# Altium footprint library 15EDGVC_VH.PcbLib: 46 footprints (part 3 of 3)
Each footprint in its own frame and in the unit in brackets; x right, y up, seen from the top. Pads: shape width x height; smd on the part's side, far side on the other; paste and mask are expansions set on the pad; w line width, h text height; cw(c..) or ccw(c..) is an arc to the next point about the centre after c.
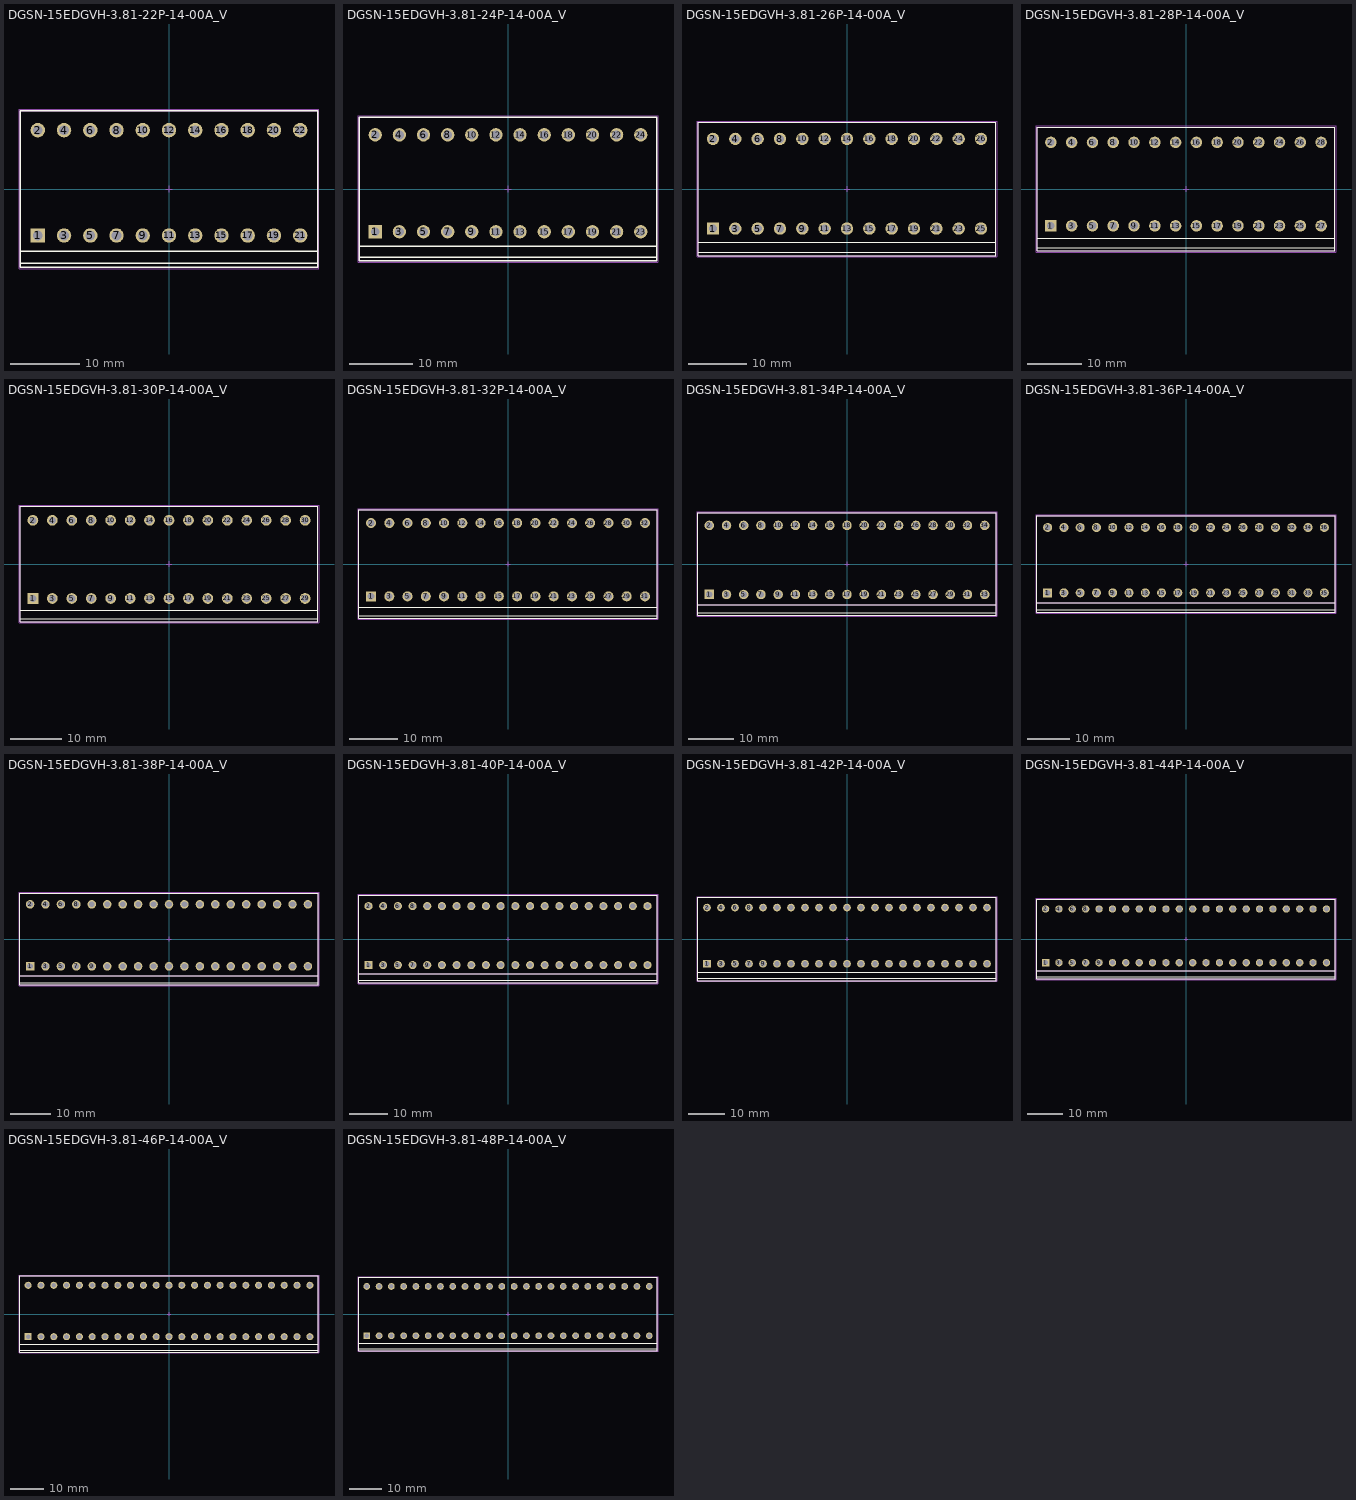
[diagram p2: the footprints below, top view; thin cyan lines are the x and y axes]

## DGSN-15EDGVH-3.81-22P-14-00A_V [mm] "Terminal Block, 22-Pin, Body 43.15x22.70mm, Pitch 3.81mm"
height 21.8
pads (22):
  rect 2.1x2.1 hole 1.4: 1(-19.05,-6.75)
  round 2.1 hole 1.4: 2(-19.05,8.55) 3(-15.24,-6.75) 4(-15.24,8.55) 5(-11.43,-6.75) 6(-11.43,8.55) 7(-7.62,-6.75) 8(-7.62,8.55) 9(-3.81,-6.75) 10(-3.81,8.55) 11(0,-6.75) 12(0,8.55) 13(3.81,-6.75) 14(3.81,8.55) 15(7.62,-6.75) 16(7.62,8.55) 17(11.43,-6.75) 18(11.43,8.55) 19(15.24,-6.75) 20(15.24,8.55) 21(19.05,-6.75) 22(19.05,8.55)
Top Overlay:
  lines w0.2: -21.575,-10.75 21.575,-10.75 ; -21.575,-9.05 21.575,-9.05 ; -21.575,-11.35 21.575,-11.35 21.575,11.35 -21.575,11.35 -21.575,-11.35
Mechanical 13:
  lines w0.1: -21.575,-9.05 21.575,-9.05 ; -21.575,-11.35 21.575,-11.35 21.575,11.35 -21.575,11.35 -21.575,-11.35
Mechanical 15:
  lines w0.05: -21.775,-11.55 21.775,-11.55 21.775,11.55 -21.775,11.55 -21.775,-11.55
  lines w0.1: -0.5,0 0.5,0 ; 0,-0.5 0,0.5
3D body "15EDGVH-3.81-22P-14-00AH.STEP": height 21.8, standoff -3.4, extent -21.575,-11.35 21.565,11.35

## DGSN-15EDGVH-3.81-24P-14-00A_V [mm] "Terminal Block, 24-Pin, Body 46.96x22.70mm, Pitch 3.81mm"
height 21.8
pads (24):
  rect 2.1x2.1 hole 1.4: 1(-20.955,-6.75)
  round 2.1 hole 1.4: 2(-20.955,8.55) 3(-17.145,-6.75) 4(-17.145,8.55) 5(-13.335,-6.75) 6(-13.335,8.55) 7(-9.525,-6.75) 8(-9.525,8.55) 9(-5.715,-6.75) 10(-5.715,8.55) 11(-1.905,-6.75) 12(-1.905,8.55) 13(1.905,-6.75) 14(1.905,8.55) 15(5.715,-6.75) 16(5.715,8.55) 17(9.525,-6.75) 18(9.525,8.55) 19(13.335,-6.75) 20(13.335,8.55) 21(17.145,-6.75) 22(17.145,8.55) 23(20.955,-6.75) 24(20.955,8.55)
Top Overlay:
  lines w0.2: -23.48,-10.75 23.48,-10.75 ; -23.48,-9.05 23.48,-9.05 ; -23.48,-11.35 23.48,-11.35 23.48,11.35 -23.48,11.35 -23.48,-11.35
Mechanical 13:
  lines w0.1: -23.48,-9.05 23.48,-9.05 ; -23.48,-11.35 23.48,-11.35 23.48,11.35 -23.48,11.35 -23.48,-11.35
Mechanical 15:
  lines w0.05: -23.68,-11.55 23.68,-11.55 23.68,11.55 -23.68,11.55 -23.68,-11.55
  lines w0.1: -0.5,0 0.5,0 ; 0,-0.5 0,0.5
3D body "15EDGVH-3.81-24P-14-00AH.STEP": height 21.8, standoff -3.4, extent -23.48,-11.35 23.47,11.35

## DGSN-15EDGVH-3.81-26P-14-00A_V [mm] "Terminal Block, 26-Pin, Body 50.77x22.70mm, Pitch 3.81mm"
height 21.8
pads (26):
  rect 2.1x2.1 hole 1.4: 1(-22.86,-6.75)
  round 2.1 hole 1.4: 2(-22.86,8.55) 3(-19.05,-6.75) 4(-19.05,8.55) 5(-15.24,-6.75) 6(-15.24,8.55) 7(-11.43,-6.75) 8(-11.43,8.55) 9(-7.62,-6.75) 10(-7.62,8.55) 11(-3.81,-6.75) 12(-3.81,8.55) 13(0,-6.75) 14(0,8.55) 15(3.81,-6.75) 16(3.81,8.55) 17(7.62,-6.75) 18(7.62,8.55) 19(11.43,-6.75) 20(11.43,8.55) 21(15.24,-6.75) 22(15.24,8.55) 23(19.05,-6.75) 24(19.05,8.55) 25(22.86,-6.75) 26(22.86,8.55)
Top Overlay:
  lines w0.2: -25.385,-10.75 25.385,-10.75 ; -25.385,-9.05 25.385,-9.05 ; -25.385,-11.35 25.385,-11.35 25.385,11.35 -25.385,11.35 -25.385,-11.35
Mechanical 13:
  lines w0.1: -25.385,-9.05 25.385,-9.05 ; -25.385,-11.35 25.385,-11.35 25.385,11.35 -25.385,11.35 -25.385,-11.35
Mechanical 15:
  lines w0.05: -25.585,-11.55 25.585,-11.55 25.585,11.55 -25.585,11.55 -25.585,-11.55
  lines w0.1: -0.5,0 0.5,0 ; 0,-0.5 0,0.5
3D body "15EDGVH-3.81-26P-14-00AH.STEP": height 21.8, standoff -3.4, extent -25.385,-11.35 25.375,11.35

## DGSN-15EDGVH-3.81-28P-14-00A_V [mm] "Terminal Block, 28-Pin, Body 54.58x22.70mm, Pitch 3.81mm"
height 21.8
pads (28):
  rect 2.1x2.1 hole 1.4: 1(-24.765,-6.75)
  round 2.1 hole 1.4: 2(-24.765,8.55) 3(-20.955,-6.75) 4(-20.955,8.55) 5(-17.145,-6.75) 6(-17.145,8.55) 7(-13.335,-6.75) 8(-13.335,8.55) 9(-9.525,-6.75) 10(-9.525,8.55) 11(-5.715,-6.75) 12(-5.715,8.55) 13(-1.905,-6.75) 14(-1.905,8.55) 15(1.905,-6.75) 16(1.905,8.55) 17(5.715,-6.75) 18(5.715,8.55) 19(9.525,-6.75) 20(9.525,8.55) 21(13.335,-6.75) 22(13.335,8.55) 23(17.145,-6.75) 24(17.145,8.55) 25(20.955,-6.75) 26(20.955,8.55) 27(24.765,-6.75) 28(24.765,8.55)
Top Overlay:
  lines w0.2: -27.29,-10.75 27.29,-10.75 ; -27.29,-9.05 27.29,-9.05 ; -27.29,-11.35 27.29,-11.35 27.29,11.35 -27.29,11.35 -27.29,-11.35
Mechanical 13:
  lines w0.1: -27.29,-9.05 27.29,-9.05 ; -27.29,-11.35 27.29,-11.35 27.29,11.35 -27.29,11.35 -27.29,-11.35
Mechanical 15:
  lines w0.05: -27.49,-11.55 27.49,-11.55 27.49,11.55 -27.49,11.55 -27.49,-11.55
  lines w0.1: -0.5,0 0.5,0 ; 0,-0.5 0,0.5
3D body "15EDGVH-3.81-28P-14-00AH.STEP": height 21.8, standoff -3.4, extent -27.29,-11.35 27.28,11.35

## DGSN-15EDGVH-3.81-30P-14-00A_V [mm] "Terminal Block, 30-Pin, Body 58.39x22.70mm, Pitch 3.81mm"
height 21.8
pads (30):
  rect 2.1x2.1 hole 1.4: 1(-26.67,-6.75)
  round 2.1 hole 1.4: 2(-26.67,8.55) 3(-22.86,-6.75) 4(-22.86,8.55) 5(-19.05,-6.75) 6(-19.05,8.55) 7(-15.24,-6.75) 8(-15.24,8.55) 9(-11.43,-6.75) 10(-11.43,8.55) 11(-7.62,-6.75) 12(-7.62,8.55) 13(-3.81,-6.75) 14(-3.81,8.55) 15(0,-6.75) 16(0,8.55) 17(3.81,-6.75) 18(3.81,8.55) 19(7.62,-6.75) 20(7.62,8.55) 21(11.43,-6.75) 22(11.43,8.55) 23(15.24,-6.75) 24(15.24,8.55) 25(19.05,-6.75) 26(19.05,8.55) 27(22.86,-6.75) 28(22.86,8.55) 29(26.67,-6.75) 30(26.67,8.55)
Top Overlay:
  lines w0.2: -29.195,-10.75 29.195,-10.75 ; -29.195,-9.05 29.195,-9.05 ; -29.195,-11.35 -29.195,11.35 29.195,11.35 29.195,-11.35 -29.195,-11.35
Mechanical 13:
  lines w0.1: -29.195,-9.05 29.195,-9.05 ; -29.195,-11.35 -29.195,11.35 29.195,11.35 29.195,-11.35 -29.195,-11.35
Mechanical 15:
  lines w0.05: -29.395,-11.55 -29.395,11.55 29.395,11.55 29.395,-11.55 -29.395,-11.55
  lines w0.1: -0.5,0 0.5,0 ; 0,-0.5 0,0.5
3D body "15EDGVH-3.81-30P-14-00AH.STEP": height 21.8, standoff -3.4, extent -29.195,-11.35 29.185,11.35

## DGSN-15EDGVH-3.81-32P-14-00A_V [mm] "Terminal Block, 32-Pin, Body 62.20x22.70mm, Pitch 3.81mm"
height 21.8
pads (32):
  rect 2.1x2.1 hole 1.4: 1(-28.575,-6.75)
  round 2.1 hole 1.4: 2(-28.575,8.55) 3(-24.765,-6.75) 4(-24.765,8.55) 5(-20.955,-6.75) 6(-20.955,8.55) 7(-17.145,-6.75) 8(-17.145,8.55) 9(-13.335,-6.75) 10(-13.335,8.55) 11(-9.525,-6.75) 12(-9.525,8.55) 13(-5.715,-6.75) 14(-5.715,8.55) 15(-1.905,-6.75) 16(-1.905,8.55) 17(1.905,-6.75) 18(1.905,8.55) 19(5.715,-6.75) 20(5.715,8.55) 21(9.525,-6.75) 22(9.525,8.55) 23(13.335,-6.75) 24(13.335,8.55) 25(17.145,-6.75) 26(17.145,8.55) 27(20.955,-6.75) 28(20.955,8.55) 29(24.765,-6.75) 30(24.765,8.55) 31(28.575,-6.75) 32(28.575,8.55)
Top Overlay:
  lines w0.2: -31.1,-10.75 31.1,-10.75 ; -31.1,-9.05 31.1,-9.05 ; -31.1,-11.35 -31.1,11.35 31.1,11.35 31.1,-11.35 -31.1,-11.35
Mechanical 13:
  lines w0.1: -31.1,-9.05 31.1,-9.05 ; -31.1,-11.35 -31.1,11.35 31.1,11.35 31.1,-11.35 -31.1,-11.35
Mechanical 15:
  lines w0.05: -31.3,-11.55 -31.3,11.55 31.3,11.55 31.3,-11.55 -31.3,-11.55
  lines w0.1: -0.5,0 0.5,0 ; 0,-0.5 0,0.5
3D body "15EDGVH-3.81-32P-14-00AH.STEP": height 21.8, standoff -3.4, extent -31.1,-11.35 31.09,11.35

## DGSN-15EDGVH-3.81-34P-14-00A_V [mm] "Terminal Block, 34-Pin, Body 66.01x22.70mm, Pitch 3.81mm"
height 21.8
pads (34):
  rect 2.1x2.1 hole 1.4: 1(-30.48,-6.75)
  round 2.1 hole 1.4: 2(-30.48,8.55) 3(-26.67,-6.75) 4(-26.67,8.55) 5(-22.86,-6.75) 6(-22.86,8.55) 7(-19.05,-6.75) 8(-19.05,8.55) 9(-15.24,-6.75) 10(-15.24,8.55) 11(-11.43,-6.75) 12(-11.43,8.55) 13(-7.62,-6.75) 14(-7.62,8.55) 15(-3.81,-6.75) 16(-3.81,8.55) 17(0,-6.75) 18(0,8.55) 19(3.81,-6.75) 20(3.81,8.55) 21(7.62,-6.75) 22(7.62,8.55) 23(11.43,-6.75) 24(11.43,8.55) 25(15.24,-6.75) 26(15.24,8.55) 27(19.05,-6.75) 28(19.05,8.55) 29(22.86,-6.75) 30(22.86,8.55) 31(26.67,-6.75) 32(26.67,8.55) 33(30.48,-6.75) 34(30.48,8.55)
Top Overlay:
  lines w0.2: -33.005,-10.75 33.005,-10.75 ; -33.005,-9.05 33.005,-9.05 ; -33.005,-11.35 -33.005,11.35 33.005,11.35 33.005,-11.35 -33.005,-11.35
Mechanical 13:
  lines w0.1: -33.005,-9.05 33.005,-9.05 ; -33.005,-11.35 -33.005,11.35 33.005,11.35 33.005,-11.35 -33.005,-11.35
Mechanical 15:
  lines w0.05: -33.205,-11.55 -33.205,11.55 33.205,11.55 33.205,-11.55 -33.205,-11.55
  lines w0.1: -0.5,0 0.5,0 ; 0,-0.5 0,0.5
3D body "15EDGVH-3.81-34P-14-00AH.STEP": height 21.8, standoff -3.4, extent -33.005,-11.35 32.995,11.35

## DGSN-15EDGVH-3.81-36P-14-00A_V [mm] "Terminal Block, 36-Pin, Body 69.82x22.70mm, Pitch 3.81mm"
height 21.8
pads (36):
  rect 2.1x2.1 hole 1.4: 1(-32.385,-6.75)
  round 2.1 hole 1.4: 2(-32.385,8.55) 3(-28.575,-6.75) 4(-28.575,8.55) 5(-24.765,-6.75) 6(-24.765,8.55) 7(-20.955,-6.75) 8(-20.955,8.55) 9(-17.145,-6.75) 10(-17.145,8.55) 11(-13.335,-6.75) 12(-13.335,8.55) 13(-9.525,-6.75) 14(-9.525,8.55) 15(-5.715,-6.75) 16(-5.715,8.55) 17(-1.905,-6.75) 18(-1.905,8.55) 19(1.905,-6.75) 20(1.905,8.55) 21(5.715,-6.75) 22(5.715,8.55) 23(9.525,-6.75) 24(9.525,8.55) 25(13.335,-6.75) 26(13.335,8.55) 27(17.145,-6.75) 28(17.145,8.55) 29(20.955,-6.75) 30(20.955,8.55) 31(24.765,-6.75) 32(24.765,8.55) 33(28.575,-6.75) 34(28.575,8.55) 35(32.385,-6.75) 36(32.385,8.55)
Top Overlay:
  lines w0.2: -34.91,-10.75 34.91,-10.75 ; -34.91,-9.05 34.91,-9.05 ; -34.91,-11.35 -34.91,11.35 34.91,11.35 34.91,-11.35 -34.91,-11.35
Mechanical 13:
  lines w0.1: -34.91,-9.05 34.91,-9.05 ; -34.91,-11.35 -34.91,11.35 34.91,11.35 34.91,-11.35 -34.91,-11.35
Mechanical 15:
  lines w0.05: -35.11,-11.55 -35.11,11.55 35.11,11.55 35.11,-11.55 -35.11,-11.55
  lines w0.1: -0.5,0 0.5,0 ; 0,-0.5 0,0.5
3D body "15EDGVH-3.81-36P-14-00AH.STEP": height 21.8, standoff -3.4, extent -34.91,-11.35 34.9,11.35

## DGSN-15EDGVH-3.81-38P-14-00A_V [mm] "Terminal Block, 38-Pin, Body 73.63x22.70mm, Pitch 3.81mm"
height 21.8
pads (38):
  rect 2.1x2.1 hole 1.4: 1(-34.29,-6.75)
  round 2.1 hole 1.4: 2(-34.29,8.55) 3(-30.48,-6.75) 4(-30.48,8.55) 5(-26.67,-6.75) 6(-26.67,8.55) 7(-22.86,-6.75) 8(-22.86,8.55) 9(-19.05,-6.75) 10(-19.05,8.55) 11(-15.24,-6.75) 12(-15.24,8.55) 13(-11.43,-6.75) 14(-11.43,8.55) 15(-7.62,-6.75) 16(-7.62,8.55) 17(-3.81,-6.75) 18(-3.81,8.55) 19(0,-6.75) 20(0,8.55) 21(3.81,-6.75) 22(3.81,8.55) 23(7.62,-6.75) 24(7.62,8.55) 25(11.43,-6.75) 26(11.43,8.55) 27(15.24,-6.75) 28(15.24,8.55) 29(19.05,-6.75) 30(19.05,8.55) 31(22.86,-6.75) 32(22.86,8.55) 33(26.67,-6.75) 34(26.67,8.55) 35(30.48,-6.75) 36(30.48,8.55) 37(34.29,-6.75) 38(34.29,8.55)
Top Overlay:
  lines w0.2: -36.815,-10.75 36.815,-10.75 ; -36.815,-9.05 36.815,-9.05 ; -36.815,-11.35 36.815,-11.35 36.815,11.35 -36.815,11.35 -36.815,-11.35
Mechanical 13:
  lines w0.1: -36.815,-9.05 36.815,-9.05 ; -36.815,-11.35 36.815,-11.35 36.815,11.35 -36.815,11.35 -36.815,-11.35
Mechanical 15:
  lines w0.05: -37.015,-11.55 37.015,-11.55 37.015,11.55 -37.015,11.55 -37.015,-11.55
  lines w0.1: -0.5,0 0.5,0 ; 0,-0.5 0,0.5
3D body "15EDGVH-3.81-38P-14-00AH.STEP": height 21.8, standoff -3.4, extent -36.815,-11.35 36.805,11.35

## DGSN-15EDGVH-3.81-40P-14-00A_V [mm] "Terminal Block, 40-Pin, Body 77.44x22.70mm, Pitch 3.81mm"
height 21.8
pads (40):
  rect 2.1x2.1 hole 1.4: 1(-36.195,-6.75)
  round 2.1 hole 1.4: 2(-36.195,8.55) 3(-32.385,-6.75) 4(-32.385,8.55) 5(-28.575,-6.75) 6(-28.575,8.55) 7(-24.765,-6.75) 8(-24.765,8.55) 9(-20.955,-6.75) 10(-20.955,8.55) 11(-17.145,-6.75) 12(-17.145,8.55) 13(-13.335,-6.75) 14(-13.335,8.55) 15(-9.525,-6.75) 16(-9.525,8.55) 17(-5.715,-6.75) 18(-5.715,8.55) 19(-1.905,-6.75) 20(-1.905,8.55) 21(1.905,-6.75) 22(1.905,8.55) 23(5.715,-6.75) 24(5.715,8.55) 25(9.525,-6.75) 26(9.525,8.55) 27(13.335,-6.75) 28(13.335,8.55) 29(17.145,-6.75) 30(17.145,8.55) 31(20.955,-6.75) 32(20.955,8.55) 33(24.765,-6.75) 34(24.765,8.55) 35(28.575,-6.75) 36(28.575,8.55) 37(32.385,-6.75) 38(32.385,8.55) 39(36.195,-6.75) 40(36.195,8.55)
Top Overlay:
  lines w0.2: -38.72,-10.75 38.72,-10.75 ; -38.72,-9.05 38.72,-9.05 ; -38.72,-11.35 38.72,-11.35 38.72,11.35 -38.72,11.35 -38.72,-11.35
Mechanical 13:
  lines w0.1: -38.72,-9.05 38.72,-9.05 ; -38.72,-11.35 38.72,-11.35 38.72,11.35 -38.72,11.35 -38.72,-11.35
Mechanical 15:
  lines w0.05: -38.92,-11.55 38.92,-11.55 38.92,11.55 -38.92,11.55 -38.92,-11.55
  lines w0.1: -0.5,0 0.5,0 ; 0,-0.5 0,0.5
3D body "15EDGVH-3.81-40P-14-00AH.STEP": height 21.8, standoff -3.4, extent -38.72,-11.35 38.71,11.35

## DGSN-15EDGVH-3.81-42P-14-00A_V [mm] "Terminal Block, 42-Pin, Body 81.25x22.70mm, Pitch 3.81mm"
height 21.8
pads (42):
  rect 2.1x2.1 hole 1.4: 1(-38.1,-6.75)
  round 2.1 hole 1.4: 2(-38.1,8.55) 3(-34.29,-6.75) 4(-34.29,8.55) 5(-30.48,-6.75) 6(-30.48,8.55) 7(-26.67,-6.75) 8(-26.67,8.55) 9(-22.86,-6.75) 10(-22.86,8.55) 11(-19.05,-6.75) 12(-19.05,8.55) 13(-15.24,-6.75) 14(-15.24,8.55) 15(-11.43,-6.75) 16(-11.43,8.55) 17(-7.62,-6.75) 18(-7.62,8.55) 19(-3.81,-6.75) 20(-3.81,8.55) 21(0,-6.75) 22(0,8.55) 23(3.81,-6.75) 24(3.81,8.55) 25(7.62,-6.75) 26(7.62,8.55) 27(11.43,-6.75) 28(11.43,8.55) 29(15.24,-6.75) 30(15.24,8.55) 31(19.05,-6.75) 32(19.05,8.55) 33(22.86,-6.75) 34(22.86,8.55) 35(26.67,-6.75) 36(26.67,8.55) 37(30.48,-6.75) 38(30.48,8.55) 39(34.29,-6.75) 40(34.29,8.55) 41(38.1,-6.75) 42(38.1,8.55)
Top Overlay:
  lines w0.2: -40.625,-10.75 40.625,-10.75 ; -40.625,-9.05 40.625,-9.05 ; -40.625,-11.35 40.625,-11.35 40.625,11.35 -40.625,11.35 -40.625,-11.35
Mechanical 13:
  lines w0.1: -40.625,-9.05 40.625,-9.05 ; -40.625,-11.35 40.625,-11.35 40.625,11.35 -40.625,11.35 -40.625,-11.35
Mechanical 15:
  lines w0.05: -40.825,-11.55 40.825,-11.55 40.825,11.55 -40.825,11.55 -40.825,-11.55
  lines w0.1: -0.5,0 0.5,0 ; 0,-0.5 0,0.5
3D body "15EDGVH-3.81-42P-14-00AH.STEP": height 21.8, standoff -3.4, extent -40.625,-11.35 40.615,11.35

## DGSN-15EDGVH-3.81-44P-14-00A_V [mm] "Terminal Block, 44-Pin, Body 85.06x22.70mm, Pitch 3.81mm"
height 21.8
pads (44):
  rect 2.1x2.1 hole 1.4: 1(-40.005,-6.75)
  round 2.1 hole 1.4: 2(-40.005,8.55) 3(-36.195,-6.75) 4(-36.195,8.55) 5(-32.385,-6.75) 6(-32.385,8.55) 7(-28.575,-6.75) 8(-28.575,8.55) 9(-24.765,-6.75) 10(-24.765,8.55) 11(-20.955,-6.75) 12(-20.955,8.55) 13(-17.145,-6.75) 14(-17.145,8.55) 15(-13.335,-6.75) 16(-13.335,8.55) 17(-9.525,-6.75) 18(-9.525,8.55) 19(-5.715,-6.75) 20(-5.715,8.55) 21(-1.905,-6.75) 22(-1.905,8.55) 23(1.905,-6.75) 24(1.905,8.55) 25(5.715,-6.75) 26(5.715,8.55) 27(9.525,-6.75) 28(9.525,8.55) 29(13.335,-6.75) 30(13.335,8.55) 31(17.145,-6.75) 32(17.145,8.55) 33(20.955,-6.75) 34(20.955,8.55) 35(24.765,-6.75) 36(24.765,8.55) 37(28.575,-6.75) 38(28.575,8.55) 39(32.385,-6.75) 40(32.385,8.55) 41(36.195,-6.75) 42(36.195,8.55) 43(40.005,-6.75) 44(40.005,8.55)
Top Overlay:
  lines w0.2: -42.53,-10.75 42.53,-10.75 ; -42.53,-9.05 42.53,-9.05 ; -42.53,-11.35 42.53,-11.35 42.53,11.35 -42.53,11.35 -42.53,-11.35
Mechanical 13:
  lines w0.1: -42.53,-9.05 42.53,-9.05 ; -42.53,-11.35 42.53,-11.35 42.53,11.35 -42.53,11.35 -42.53,-11.35
Mechanical 15:
  lines w0.05: -42.73,-11.55 42.73,-11.55 42.73,11.55 -42.73,11.55 -42.73,-11.55
  lines w0.1: -0.5,0 0.5,0 ; 0,-0.5 0,0.5
3D body "15EDGVH-3.81-44P-14-00AH.STEP": height 21.8, standoff -3.4, extent -42.53,-11.35 42.52,11.35

## DGSN-15EDGVH-3.81-46P-14-00A_V [mm] "Terminal Block, 46-Pin, Body 88.87x22.70mm, Pitch 3.81mm"
height 21.8
pads (46):
  rect 2.1x2.1 hole 1.4: 1(-41.91,-6.75)
  round 2.1 hole 1.4: 2(-41.91,8.55) 3(-38.1,-6.75) 4(-38.1,8.55) 5(-34.29,-6.75) 6(-34.29,8.55) 7(-30.48,-6.75) 8(-30.48,8.55) 9(-26.67,-6.75) 10(-26.67,8.55) 11(-22.86,-6.75) 12(-22.86,8.55) 13(-19.05,-6.75) 14(-19.05,8.55) 15(-15.24,-6.75) 16(-15.24,8.55) 17(-11.43,-6.75) 18(-11.43,8.55) 19(-7.62,-6.75) 20(-7.62,8.55) 21(-3.81,-6.75) 22(-3.81,8.55) 23(0,-6.75) 24(0,8.55) 25(3.81,-6.75) 26(3.81,8.55) 27(7.62,-6.75) 28(7.62,8.55) 29(11.43,-6.75) 30(11.43,8.55) 31(15.24,-6.75) 32(15.24,8.55) 33(19.05,-6.75) 34(19.05,8.55) 35(22.86,-6.75) 36(22.86,8.55) 37(26.67,-6.75) 38(26.67,8.55) 39(30.48,-6.75) 40(30.48,8.55) 41(34.29,-6.75) 42(34.29,8.55) 43(38.1,-6.75) 44(38.1,8.55) 45(41.91,-6.75) 46(41.91,8.55)
Top Overlay:
  lines w0.2: -44.435,-10.75 44.435,-10.75 ; -44.435,-9.05 44.435,-9.05 ; -44.435,-11.35 44.435,-11.35 44.435,11.35 -44.435,11.35 -44.435,-11.35
Mechanical 13:
  lines w0.1: -44.435,-9.05 44.435,-9.05 ; -44.435,-11.35 44.435,-11.35 44.435,11.35 -44.435,11.35 -44.435,-11.35
Mechanical 15:
  lines w0.05: -44.635,-11.55 44.635,-11.55 44.635,11.55 -44.635,11.55 -44.635,-11.55
  lines w0.1: -0.5,0 0.5,0 ; 0,-0.5 0,0.5
3D body "15EDGVH-3.81-46P-14-00AH.STEP": height 21.8, standoff -3.4, extent -44.435,-11.35 44.425,11.35

## DGSN-15EDGVH-3.81-48P-14-00A_V [mm] "Terminal Block, 48-Pin, Body 92.68x22.70mm, Pitch 3.81mm"
height 21.8
pads (48):
  rect 2.1x2.1 hole 1.4: 1(-43.815,-6.75)
  round 2.1 hole 1.4: 2(-43.815,8.55) 3(-40.005,-6.75) 4(-40.005,8.55) 5(-36.195,-6.75) 6(-36.195,8.55) 7(-32.385,-6.75) 8(-32.385,8.55) 9(-28.575,-6.75) 10(-28.575,8.55) 11(-24.765,-6.75) 12(-24.765,8.55) 13(-20.955,-6.75) 14(-20.955,8.55) 15(-17.145,-6.75) 16(-17.145,8.55) 17(-13.335,-6.75) 18(-13.335,8.55) 19(-9.525,-6.75) 20(-9.525,8.55) 21(-5.715,-6.75) 22(-5.715,8.55) 23(-1.905,-6.75) 24(-1.905,8.55) 25(1.905,-6.75) 26(1.905,8.55) 27(5.715,-6.75) 28(5.715,8.55) 29(9.525,-6.75) 30(9.525,8.55) 31(13.335,-6.75) 32(13.335,8.55) 33(17.145,-6.75) 34(17.145,8.55) 35(20.955,-6.75) 36(20.955,8.55) 37(24.765,-6.75) 38(24.765,8.55) 39(28.575,-6.75) 40(28.575,8.55) 41(32.385,-6.75) 42(32.385,8.55) 43(36.195,-6.75) 44(36.195,8.55) 45(40.005,-6.75) 46(40.005,8.55) 47(43.815,-6.75) 48(43.815,8.55)
Top Overlay:
  lines w0.2: -46.34,-10.75 46.34,-10.75 ; -46.34,-9.05 46.34,-9.05 ; -46.34,-11.35 -46.34,11.35 46.34,11.35 46.34,-11.35 -46.34,-11.35
Mechanical 13:
  lines w0.1: -46.34,-9.05 46.34,-9.05 ; -46.34,-11.35 -46.34,11.35 46.34,11.35 46.34,-11.35 -46.34,-11.35
Mechanical 15:
  lines w0.05: -46.54,-11.55 -46.54,11.55 46.54,11.55 46.54,-11.55 -46.54,-11.55
  lines w0.1: -0.5,0 0.5,0 ; 0,-0.5 0,0.5
3D body "15EDGVH-3.81-48P-14-00AH.STEP": height 21.8, standoff -3.4, extent -46.34,-11.35 46.33,11.35